# Altium footprint library SOP.PcbLib: 12 footprints
Each footprint in its own frame and in the unit in brackets; x right, y up, seen from the top. Pads: shape width x height; smd on the part's side, far side on the other; paste and mask are expansions set on the pad; w line width, h text height; cw(c..) or ccw(c..) is an arc to the next point about the centre after c.
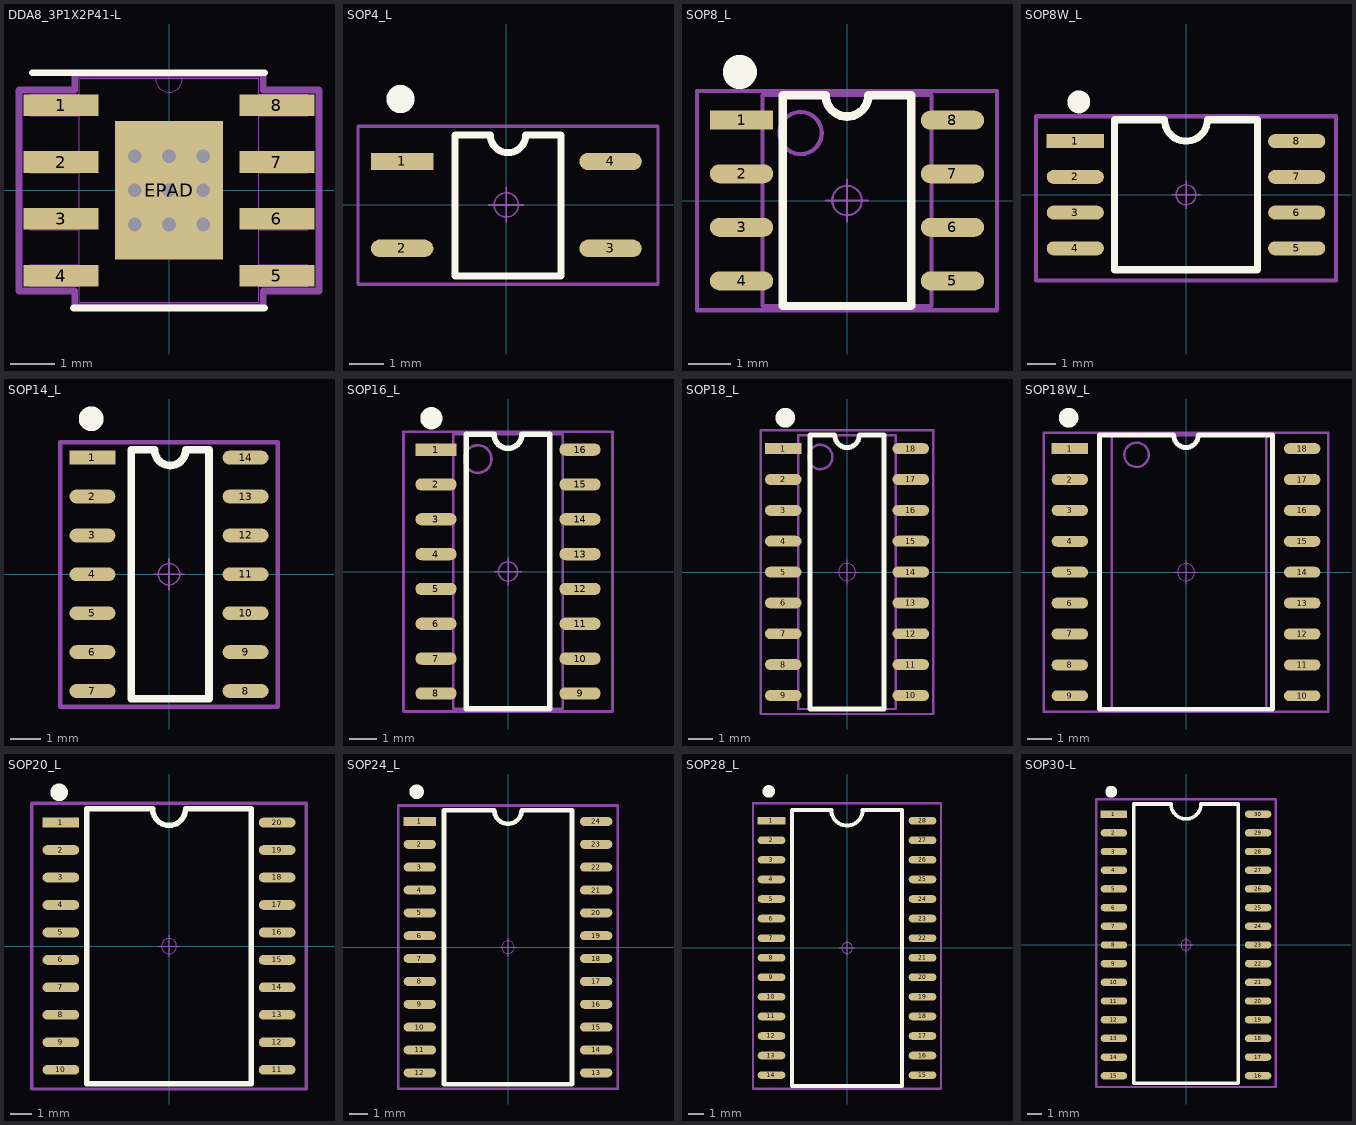
[diagram p0: the footprints below, top view; thin cyan lines are the x and y axes]

## DDA8_3P1X2P41-L [mil]
pads (9):
  rect 66x19 smd paste+0 mask+0: 1(-95,75) 2(-95,25) 3(-95,-25) 4(-95,-75) 5(95,-75) 6(95,-25) 7(95,25) 8(95,75)
  rect 95x122 smd paste-60.5 mask-60.5: EPAD(0,0)
via -30,30 diameter 20 hole 12
via 0,30 diameter 20 hole 12
via 30,30 diameter 20 hole 12
via 30,0 diameter 20 hole 12
via 30,-30 diameter 20 hole 12
via -30,-30 diameter 20 hole 12
via 0,-30 diameter 20 hole 12
via 0,0 diameter 20 hole 12
via -30,0 diameter 20 hole 12
Top Overlay:
  lines w6: -120,103.5 84,103.5 ; -84,-103.5 84,-103.5
Top Paste:
  drawing of 16 lines, arcs and shapes, not listed
Top Solder:
  region: 38.87,-63.5 38.87,63.5 50,63.5 50,-63.5
  region: 23.13,-63.5 23.13,63.5 7.87,63.5 7.87,-63.5
  region: -7.87,-63.5 -7.87,63.5 -23.13,63.5 -23.13,-63.5
  region: -50,-63.5 -50,63.5 -38.87,63.5 -38.87,-63.5
  region: -50,-63.5 -50,-38.87 50,-38.87 50,-63.5
  region: -50,-23.13 -50,-7.87 50,-7.87 50,-23.13
  region: -50,7.87 -50,23.13 50,23.13 50,7.87
  region: -50,38.87 -50,63.5 50,63.5 50,38.87
Mechanical 13:
  lines w0: -12,98.5 ccw(c0,98.5) 12,98.5
  lines w1: -122,-84.5 -79,-84.5 -79,-65.5 -122,-65.5 -122,-84.5 ; -122,-34.5 -79,-34.5 -79,-15.5 -122,-15.5 -122,-34.5 ; -122,15.5 -79,15.5 -79,34.5 -122,34.5 -122,15.5 ; -122,65.5 -79,65.5 -79,84.5 -122,84.5 -122,65.5 ; -79,-98.5 -79,98.5 79,98.5 79,-98.5 -79,-98.5 ; 79,-84.5 122,-84.5 122,-65.5 79,-65.5 79,-84.5 ; 79,-34.5 122,-34.5 122,-15.5 79,-15.5 79,-34.5 ; 79,15.5 122,15.5 122,34.5 79,34.5 79,15.5 ; 79,65.5 122,65.5 122,84.5 79,84.5 79,65.5
  text "*" at -76.5,45.5 h50
Mechanical 15:
  lines w6: -132,-88.5 -132,88.5 -83,88.5 -83,102.5 83,102.5 83,88.5 132,88.5 132,-88.5 83,-88.5 83,-102.5 -83,-102.5 -83,-88.5 -132,-88.5
3D body "DDA8_3P1X2P41.step": height 67.09, standoff 0, extent -122.01,-98.5 122.01,98.5

## SOP4_L [mm] "4.4*6.8*2.1mm（长宽高）"
pads (4):
  rect 1.8x0.5 smd: 1(-3,1.25)
  oval 1.8x0.5 smd: 2(-3,-1.25) 3(3,-1.25) 4(3,1.25)
Top Overlay:
  circle w0.5: c-3.048,3.048 r0.155
  lines w0.2: -1.476,2.012 -1.476,-2.052 1.572,-2.052 1.572,2.012
  lines w0.203: -1.476,2.012 -0.46,2.012 ccw(c0.048,2.012) 0.048,1.504 ccw(c0.048,2.012) 0.556,2.012 1.572,2.012
Mechanical 15:
  circle w0.05: c0,0 r0.35
  lines w0.05: -0.5,0 0.5,0 ; 0,-0.5 0,0.5
  lines w0.1: -4.27,-2.286 4.366,-2.286 4.366,2.266 -4.27,2.266 -4.27,-2.286
3D body "SOP4.STEP": height 1.9, standoff 0, extent -3.404,-2.15 3.404,2.15

## SOP8_L [mm] "5*6*1.8mm（长宽高）"
height 1.75
pads (8):
  rect 1.5x0.45 smd: 1(-2.5,1.905)
  oval 1.5x0.45 smd: 2(-2.5,0.635) 3(-2.5,-0.635) 4(-2.5,-1.905) 5(2.5,-1.905) 6(2.5,-0.635) 7(2.5,0.635) 8(2.5,1.905)
Top Overlay:
  circle w0.5: c-2.54,3.048 r0.155
  lines w0.2: -1.524,2.5 -1.524,-2.5 1.524,-2.5 1.524,2.5
  lines w0.203: -1.524,2.5 -0.508,2.5 ccw(c0,2.5) 0,1.992 ccw(c0,2.5) 0.508,2.5 1.524,2.5
Mechanical 13:
  circle w0.1: c-1.1,1.6 r0.5
  lines w0.1: -2,-2.5 -2,2.5 2,2.5 2,-2.5 -2,-2.5
Mechanical 15:
  circle w0.05: c0,0 r0.35
  lines w0.05: -0.5,0 0.5,0 ; 0,-0.5 0,0.5
  lines w0.1: -3.556,-2.6 -3.556,2.6 3.556,2.6 3.556,-2.6 -3.556,-2.6
3D body "SOP8.STEP": height 1.9, standoff 0, extent -3.003,-2.5 3.003,2.5

## SOP8W_L [mm] "5.3*8.3*1.8mm（长宽高）"
pads (8):
  rect 2.032x0.5 smd: 1(-3.937,1.905)
  oval 2.032x0.5 smd: 2(-3.937,0.635) 3(-3.937,-0.635) 4(-3.937,-1.905) 5(3.937,-1.905) 6(3.937,-0.635) 7(3.937,0.635) 8(3.937,1.905)
Top Overlay:
  circle w0.5: c-3.81,3.302 r0.155
  lines w0.254: -2.54,-2.667 -2.54,2.667 -0.762,2.667 ccw(c0,2.667) 0.762,2.667 2.54,2.667 2.54,-2.667 -2.54,-2.667
Mechanical 15:
  circle w0.05: c0,0 r0.35
  lines w0.05: -0.5,0 0.5,0 ; 0,-0.5 0,0.5
  lines w0.15: -5.334,-3.048 -5.334,2.794 5.334,2.794 5.334,-3.048 -5.334,-3.048
3D body "SOP8W.STEP": height 1.9, standoff 0, extent -3.943,-2.64 3.943,2.64

## SOP14_L [mm] "8.7*6.2*1.8mm（长宽高）"
pads (14):
  rect 1.5x0.45 smd: 1(-2.5,3.81)
  oval 1.5x0.45 smd: 2(-2.5,2.54) 3(-2.5,1.27) 4(-2.5,0) 5(-2.5,-1.27) 6(-2.5,-2.54) 7(-2.5,-3.81) 8(2.5,-3.81) 9(2.5,-2.54) 10(2.5,-1.27) 11(2.5,0) 12(2.5,1.27) 13(2.5,2.54) 14(2.5,3.81)
Top Overlay:
  circle w0.5: c-2.54,5.08 r0.155
  lines w0.254: -1.23,-4.064 -1.23,4.064 -0.468,4.064 ccw(c0.04,4.064) 0.04,3.556 ccw(c0.04,4.064) 0.548,4.064 1.31,4.064 1.31,-4.064 -1.23,-4.064
Mechanical 15:
  circle w0.05: c0,0 r0.35
  lines w0.05: -0.5,0 0.5,0 ; 0,-0.5 0,0.5
  lines w0.15: -3.556,-4.318 3.556,-4.318 3.556,4.318 -3.556,4.318 -3.556,-4.318
3D body "SOP14.STEP": height 1.9, standoff 0, extent -3.003,-4.35 3.003,4.35

## SOP16_L [mm] "10.3*6.2*1.8mm（长宽高）"
height 1.75
pads (16):
  rect 1.5x0.45 smd: 1(-2.625,4.445)
  oval 1.5x0.45 smd: 2(-2.625,3.175) 3(-2.625,1.905) 4(-2.625,0.635) 5(-2.625,-0.635) 6(-2.625,-1.905) 7(-2.625,-3.175) 8(-2.625,-4.445) 9(2.625,-4.445) 10(2.625,-3.175) 11(2.625,-1.905) 12(2.625,-0.635) 13(2.625,0.635) 14(2.625,1.905) 15(2.625,3.175) 16(2.625,4.445)
Top Overlay:
  circle w0.5: c-2.794,5.588 r0.155
  lines w0.2: -1.524,5 -1.524,-5 1.524,-5 1.524,5
  lines w0.203: -1.524,5 -0.508,5 ccw(c0,5) 0,4.492 ccw(c0,5) 0.508,5 1.524,5
Mechanical 13:
  circle w0.1: c-1.1,4.1 r0.5
  lines w0.1: -2,-5 -2,5 2,5 2,-5 -2,-5
Mechanical 15:
  circle w0.05: c0,0 r0.35
  lines w0.05: -0.5,0 0.5,0 ; 0,-0.5 0,0.5
  lines w0.1: -3.81,-5.1 -3.81,5.1 3.81,5.1 3.81,-5.1 -3.81,-5.1
3D body "SOP16.STEP": height 1.9, standoff 0, extent -3.003,-5 3.003,5

## SOP18_L [mm] "11.5*6.2*1.8mm（长宽高）"
height 1.75
pads (18):
  rect 1.5x0.45 smd: 1(-2.625,5.08)
  oval 1.5x0.45 smd: 2(-2.625,3.81) 3(-2.625,2.54) 4(-2.625,1.27) 5(-2.625,0) 6(-2.625,-1.27) 7(-2.625,-2.54) 8(-2.625,-3.81) 9(-2.625,-5.08) 10(2.625,-5.08) 11(2.625,-3.81) 12(2.625,-2.54) 13(2.625,-1.27) 14(2.625,0) 15(2.625,1.27) 16(2.625,2.54) 17(2.625,3.81) 18(2.625,5.08)
Top Overlay:
  circle w0.5: c-2.54,6.35 r0.155
  lines w0.2: -1.524,5.635 -1.524,-5.635 1.524,-5.635 1.524,5.635
  lines w0.203: -1.524,5.635 -0.508,5.635 ccw(c0,5.635) 0,5.127 ccw(c0,5.635) 0.508,5.635 1.524,5.635
Mechanical 13:
  circle w0.1: c-1.1,4.735 r0.5
  lines w0.1: -2,-5.635 2,-5.635 2,5.635 -2,5.635 -2,-5.635
Mechanical 15:
  circle w0.05: c0,0 r0.35
  lines w0.05: -0.5,0 0.5,0 ; 0,-0.5 0,0.5
  lines w0.1: -3.556,-5.842 -3.556,5.842 3.556,5.842 3.556,-5.842 -3.556,-5.842
3D body "SOP18.STEP": height 1.9, standoff 0, extent -3.003,-5.75 3.003,5.75

## SOP18W_L [mm] "11.5*10.3*1.8mm（长宽高）"
height 1.75
pads (18):
  rect 1.5x0.45 smd: 1(-4.775,5.08)
  oval 1.5x0.45 smd: 2(-4.775,3.81) 3(-4.775,2.54) 4(-4.775,1.27) 5(-4.775,0) 6(-4.775,-1.27) 7(-4.775,-2.54) 8(-4.775,-3.81) 9(-4.775,-5.08) 10(4.775,-5.08) 11(4.775,-3.81) 12(4.775,-2.54) 13(4.775,-1.27) 14(4.775,0) 15(4.775,1.27) 16(4.775,2.54) 17(4.775,3.81) 18(4.775,5.08)
Top Overlay:
  circle w0.5: c-4.826,6.35 r0.155
  lines w0.2: -3.556,5.635 -3.556,-5.635 3.556,-5.635 3.556,5.635
  lines w0.203: -3.556,5.635 -0.508,5.635 ccw(c0,5.635) 0,5.127 ccw(c0,5.635) 0.508,5.635 3.556,5.635
Mechanical 13:
  circle w0.1: c-2.032,4.826 r0.5
  lines w0.1: -3.048,-5.635 -3.048,5.635 3.302,5.635 3.302,-5.635 -3.048,-5.635
Mechanical 15:
  circle w0.05: c0,0 r0.35
  lines w0.05: -0.5,0 0.5,0 ; 0,-0.5 0,0.5
  lines w0.1: -5.842,-5.735 5.842,-5.735 5.842,5.735 -5.842,5.735 -5.842,-5.735
3D body "SOP18W.STEP": height 2.7, standoff 0, extent -5.153,-5.75 5.153,5.75

## SOP20_L [mm] "13*10.6*2.6（长宽高）"
pads (20):
  rect 1.7x0.45 smd: 1(-5,5.715)
  oval 1.7x0.45 smd: 2(-5,4.445) 3(-5,3.175) 4(-5,1.905) 5(-5,0.635) 6(-5,-0.635) 7(-5,-1.905) 8(-5,-3.175) 9(-5,-4.445) 10(-5,-5.715) 11(5,-5.715) 12(5,-4.445) 13(5,-3.175) 14(5,-1.905) 15(5,-0.635) 16(5,0.635) 17(5,1.905) 18(5,3.175) 19(5,4.445) 20(5,5.715)
Top Overlay:
  circle w0.5: c-5.08,7.112 r0.155
  lines w0.254: -3.81,-6.35 -3.81,6.35 -0.759,6.35 ccw(c0.003,6.35) 0.003,5.588 ccw(c0.003,6.35) 0.765,6.35 3.81,6.35 3.81,-6.35 -3.81,-6.35
Mechanical 15:
  circle w0.05: c0,0 r0.35
  lines w0.05: -0.5,0 0.5,0 ; 0,-0.5 0,0.5
  lines w0.15: -6.35,-6.604 -6.35,6.604 6.35,6.604 6.35,-6.604 -6.35,-6.604
3D body "SOP20.STEP": height 2.7, standoff 0, extent -5.15,-6.35 5.156,6.35

## SOP24_L [mm] "15.4*10.6*2.6mm（长宽高）"
height 10
pads (24):
  rect 1.8x0.5 smd: 1(-4.9,6.985)
  oval 1.8x0.5 smd: 2(-4.9,5.715) 3(-4.9,4.445) 4(-4.9,3.175) 5(-4.9,1.905) 6(-4.9,0.635) 7(-4.9,-0.635) 8(-4.9,-1.905) 9(-4.9,-3.175) 10(-4.9,-4.445) 11(-4.9,-5.715) 12(-4.9,-6.985) 13(4.9,-6.985) 14(4.9,-5.715) 15(4.9,-4.445) 16(4.9,-3.175) 17(4.9,-1.905) 18(4.9,-0.635) 19(4.9,0.635) 20(4.9,1.905) 21(4.9,3.175) 22(4.9,4.445) 23(4.9,5.715) 24(4.9,6.985)
Top Overlay:
  circle w0.5: c-5.08,8.636 r0.155
  lines w0.254: -3.556,-7.62 3.556,-7.62 3.556,7.62 0.762,7.62 cw(c0,7.62) -0.762,7.62 -3.556,7.62 -3.556,-7.62
Mechanical 15:
  circle w0.05: c0,0 r0.35
  lines w0.05: -0.5,0 0.5,0 ; 0,-0.5 0,0.5
  lines w0.15: -6.096,-7.874 -6.096,7.874 6.096,7.874 6.096,-7.874 -6.096,-7.874
3D body "SOP24.STEP": height 2.7, standoff 0, extent -5.153,-7.7 5.153,7.7

## SOP28_L [mm] "17.9*10.6*2.6mm（长宽高）"
pads (28):
  rect 1.8x0.5 smd: 1(-4.9,8.255)
  oval 1.8x0.5 smd: 2(-4.9,6.985) 3(-4.9,5.715) 4(-4.9,4.445) 5(-4.9,3.175) 6(-4.9,1.905) 7(-4.9,0.635) 8(-4.9,-0.635) 9(-4.9,-1.905) 10(-4.9,-3.175) 11(-4.9,-4.445) 12(-4.9,-5.715) 13(-4.9,-6.985) 14(-4.9,-8.255) 15(4.9,-8.255) 16(4.9,-6.985) 17(4.9,-5.715) 18(4.9,-4.445) 19(4.9,-3.175) 20(4.9,-1.905) 21(4.9,-0.635) 22(4.9,0.635) 23(4.9,1.905) 24(4.9,3.175) 25(4.9,4.445) 26(4.9,5.715) 27(4.9,6.985) 28(4.9,8.255)
Top Overlay:
  circle w0.5: c-5.08,10.16 r0.155
  lines w0.254: -3.556,-8.95 3.556,-8.95 3.556,8.95 1.016,8.95 cw(c0,8.95) -1.016,8.95 -3.556,8.95 -3.556,-8.95
Mechanical 15:
  circle w0.05: c0,0 r0.35
  lines w0.05: -0.5,0 0.5,0 ; 0,-0.5 0,0.5
  lines w0.15: -6.096,-9.144 6.096,-9.144 6.096,9.398 -6.096,9.398 -6.096,-9.144
3D body "SOP28.STEP": height 2.7, standoff 0, extent -5.153,-8.95 5.153,8.95

## SOP30-L [mm] "19*10.3*2.6mm（长宽高）"
pads (30):
  rect 1.8x0.5 smd: 1(-4.9,8.89)
  oval 1.8x0.5 smd: 2(-4.9,7.62) 3(-4.9,6.35) 4(-4.9,5.08) 5(-4.9,3.81) 6(-4.9,2.54) 7(-4.9,1.27) 8(-4.9,0) 9(-4.9,-1.27) 10(-4.9,-2.54) 11(-4.9,-3.81) 12(-4.9,-5.08) 13(-4.9,-6.35) 14(-4.9,-7.62) 15(-4.9,-8.89) 16(4.9,-8.89) 17(4.9,-7.62) 18(4.9,-6.35) 19(4.9,-5.08) 20(4.9,-3.81) 21(4.9,-2.54) 22(4.9,-1.27) 23(4.9,0) 24(4.9,1.27) 25(4.9,2.54) 26(4.9,3.81) 27(4.9,5.08) 28(4.9,6.35) 29(4.9,7.62) 30(4.9,8.89)
Top Overlay:
  circle w0.5: c-5.08,10.414 r0.155
  lines w0.254: -3.556,-9.398 -3.556,9.585 -1.016,9.585 ccw(c0,9.585) 1.016,9.585 3.556,9.585 3.556,-9.398 -3.556,-9.398
Mechanical 15:
  circle w0.05: c0,0 r0.35
  lines w0.05: -0.5,0 0.5,0 ; 0,-0.5 0,0.5
  lines w0.15: -6.096,-9.652 6.096,-9.652 6.096,9.906 -6.096,9.906 -6.096,-9.652
3D body "SOP30.STEP": height 2.7, standoff 0, extent -5.153,-9.5 5.153,9.5